# Altium footprint library SAMTEC THD.PcbLib: 161 footprints (part 8 of 12)
Each footprint in its own frame and in the unit in brackets; x right, y up, seen from the top. Pads: shape width x height; smd on the part's side, far side on the other; paste and mask are expansions set on the pad; w line width, h text height; cw(c..) or ccw(c..) is an arc to the next point about the centre after c.
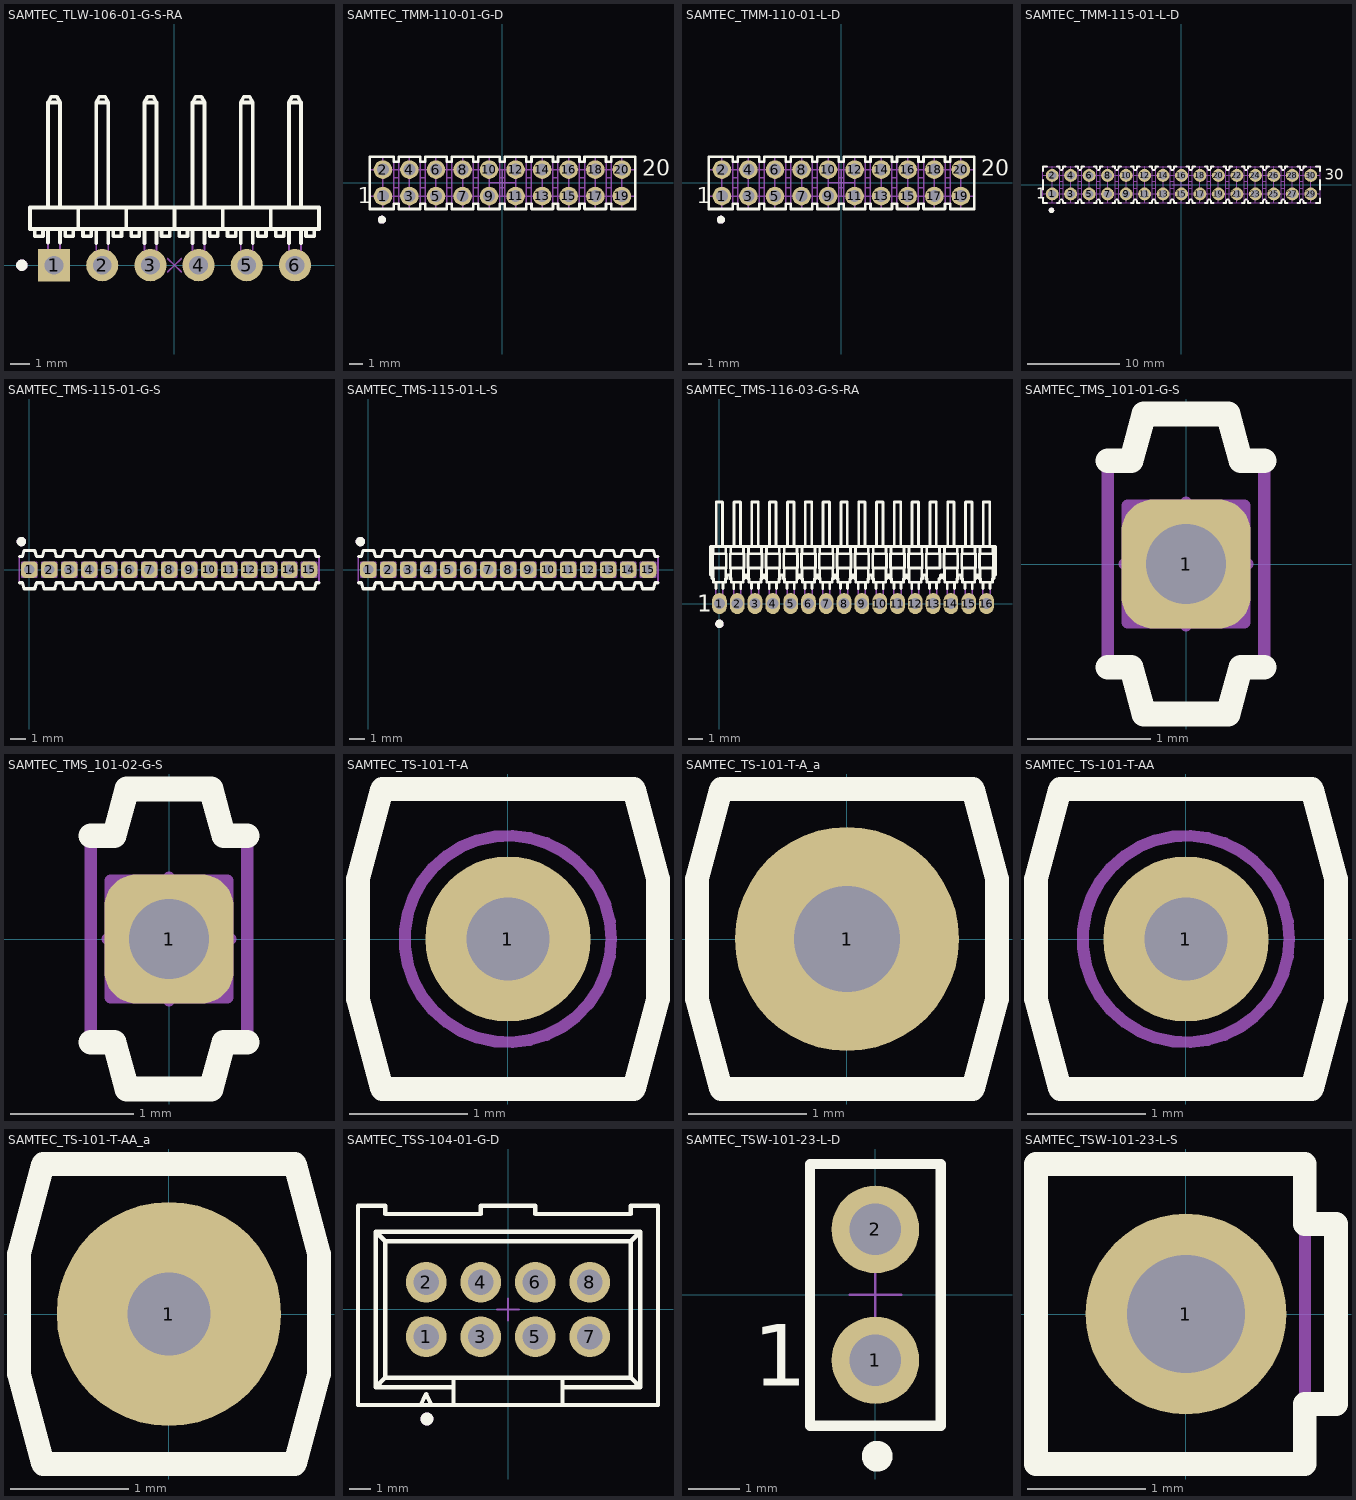
[diagram p7: the footprints below, top view; thin cyan lines are the x and y axes]

## SAMTEC_TLW-106-01-G-S-RA [mm] "6 Contacts - Pitch 2.54mm - Single Row Right Angle Low Profile Strip Header"
height 2.48
pads (6):
  rect 1.7x1.7 hole 1: 1(-6.35,0)
  round 1.7 hole 1: 2(-3.81,0) 3(-1.27,0) 4(1.27,0) 5(3.81,0) 6(6.35,0)
Top Overlay:
  circle w0.3: c-8.05,0 r0.15
  lines w0.2: -7.366,1.905 -7.366,1.524 -6.934,1.524 -6.934,1.905 ; -6.667,1.2 -6.667,1.905 ; -6.667,3.048 -6.667,8.586 ; -6.032,1.2 -6.032,1.905 ; -6.032,3.048 -6.032,8.586 ; -5.766,1.905 -5.766,1.524 -5.334,1.524 -5.334,1.905 ; -5.08,1.905 -5.08,3.048 ; -4.826,1.905 -4.826,1.524 -4.394,1.524 -4.394,1.905 ; -4.127,1.157 -4.127,1.905 ; -4.127,3.048 -4.127,8.586 ; -3.492,1.157 -3.492,1.905 ; -3.492,3.048 -3.492,8.586 ; -3.226,1.905 -3.226,1.524 -2.794,1.524 -2.794,1.905 ; -2.54,1.905 -2.54,3.048 ; -2.286,1.905 -2.286,1.524 -1.854,1.524 -1.854,1.905 ; -1.587,1.157 -1.587,1.905 ; -1.587,3.048 -1.587,8.586 ; -0.952,1.157 -0.952,1.905 ; -0.952,3.048 -0.952,8.586 ; -0.686,1.905 -0.686,1.524 -0.254,1.524 -0.254,1.905 ; 0,1.905 0,3.048 ; 0.254,1.905 0.254,1.524 0.686,1.524 0.686,1.905 ; 0.953,1.157 0.953,1.905 ; 0.953,3.048 0.953,8.586 ; 1.588,1.157 1.588,1.905 ; 1.588,3.048 1.588,8.586 ; 1.854,1.905 1.854,1.524 2.286,1.524 2.286,1.905 ; 2.54,1.905 2.54,3.048 ; 2.794,1.905 2.794,1.524 3.226,1.524 3.226,1.905 ; 3.493,1.157 3.493,1.905 ; 3.493,3.048 3.493,8.586 ; 4.128,1.157 4.128,1.905 ; 4.128,3.048 4.128,8.586 ; 4.394,1.905 4.394,1.524 4.826,1.524 4.826,1.905 ; 5.08,1.905 5.08,3.048 ; 5.334,1.905 5.334,1.524 5.766,1.524 5.766,1.905 ; 6.033,1.157 6.033,1.905 ; 6.033,3.048 6.033,8.586 ; 6.668,1.157 6.668,1.905 ; 6.668,3.048 6.668,8.586 ; 6.934,1.905 6.934,1.524 7.366,1.524 7.366,1.905 ; -6.667,8.586 -6.032,8.586 ; -6.667,8.586 -6.492,8.89 -6.208,8.89 -6.032,8.586 ; -4.127,8.586 -3.492,8.586 ; -4.127,8.586 -3.952,8.89 -3.668,8.89 -3.492,8.586 ; -1.587,8.586 -0.952,8.586 ; -1.587,8.586 -1.412,8.89 -1.128,8.89 -0.952,8.586 ; 0.953,8.586 1.588,8.586 ; 0.953,8.586 1.128,8.89 1.412,8.89 1.588,8.586 ; 3.493,8.586 4.128,8.586 ; 3.493,8.586 3.668,8.89 3.952,8.89 4.128,8.586 ; 6.033,8.586 6.668,8.586 ; 6.033,8.586 6.208,8.89 6.492,8.89 6.668,8.586 ; -7.62,1.905 -7.62,3.048 7.62,3.048 7.62,1.905 -7.62,1.905
Mechanical 8:
  lines w0.1: -6.85,0 -6.35,0 ; -6.35,-0.5 -6.35,0 ; -6.35,0.5 -6.35,0 ; -5.85,0 -6.35,0 ; -4.31,0 -3.81,0 ; -3.81,-0.5 -3.81,0 ; -3.81,0.5 -3.81,0 ; -3.31,0 -3.81,0 ; -1.77,0 -1.27,0 ; -1.27,-0.5 -1.27,0 ; -1.27,0.5 -1.27,0 ; -0.77,0 -1.27,0 ; -0.354,-0.354 0,0 ; -0.354,0.354 0,0 ; 0.354,-0.354 0,0 ; 0.354,0.354 0,0 ; 0.77,0 1.27,0 ; 1.27,-0.5 1.27,0 ; 1.27,0.5 1.27,0 ; 1.77,0 1.27,0 ; 3.31,0 3.81,0 ; 3.81,-0.5 3.81,0 ; 3.81,0.5 3.81,0 ; 4.31,0 3.81,0 ; 5.85,0 6.35,0 ; 6.35,-0.5 6.35,0 ; 6.35,0.5 6.35,0 ; 6.85,0 6.35,0
Mechanical 14:
  circle w0.3: c-8.05,0 r0.15
  lines w0.1: -7.366,1.905 -7.366,1.524 -6.934,1.524 -6.934,1.905 ; -6.667,1.905 -6.667,-0.318 -6.032,-0.318 -6.032,1.905 ; -6.667,3.048 -6.667,8.586 ; -6.032,3.048 -6.032,8.586 ; -5.766,1.905 -5.766,1.524 -5.334,1.524 -5.334,1.905 ; -5.08,1.905 -5.08,3.048 ; -4.826,1.905 -4.826,1.524 -4.394,1.524 -4.394,1.905 ; -4.127,1.905 -4.127,-0.318 -3.492,-0.318 -3.492,1.905 ; -4.127,3.048 -4.127,8.586 ; -3.492,3.048 -3.492,8.586 ; -3.226,1.905 -3.226,1.524 -2.794,1.524 -2.794,1.905 ; -2.54,1.905 -2.54,3.048 ; -2.286,1.905 -2.286,1.524 -1.854,1.524 -1.854,1.905 ; -1.587,1.905 -1.587,-0.318 -0.952,-0.318 -0.952,1.905 ; -1.587,3.048 -1.587,8.586 ; -0.952,3.048 -0.952,8.586 ; -0.686,1.905 -0.686,1.524 -0.254,1.524 -0.254,1.905 ; 0,1.905 0,3.048 ; 0.254,1.905 0.254,1.524 0.686,1.524 0.686,1.905 ; 0.953,1.905 0.953,-0.318 1.588,-0.318 1.588,1.905 ; 0.953,3.048 0.953,8.586 ; 1.588,3.048 1.588,8.586 ; 1.854,1.905 1.854,1.524 2.286,1.524 2.286,1.905 ; 2.54,1.905 2.54,3.048 ; 2.794,1.905 2.794,1.524 3.226,1.524 3.226,1.905 ; 3.493,1.905 3.493,-0.318 4.128,-0.318 4.128,1.905 ; 3.493,3.048 3.493,8.586 ; 4.128,3.048 4.128,8.586 ; 4.394,1.905 4.394,1.524 4.826,1.524 4.826,1.905 ; 5.08,1.905 5.08,3.048 ; 5.334,1.905 5.334,1.524 5.766,1.524 5.766,1.905 ; 6.033,1.905 6.033,-0.318 6.668,-0.318 6.668,1.905 ; 6.033,3.048 6.033,8.586 ; 6.668,3.048 6.668,8.586 ; 6.934,1.905 6.934,1.524 7.366,1.524 7.366,1.905 ; -6.667,8.586 -6.032,8.586 ; -6.667,8.586 -6.492,8.89 -6.208,8.89 -6.032,8.586 ; -4.127,8.586 -3.492,8.586 ; -4.127,8.586 -3.952,8.89 -3.668,8.89 -3.492,8.586 ; -1.587,8.586 -0.952,8.586 ; -1.587,8.586 -1.412,8.89 -1.128,8.89 -0.952,8.586 ; 0.953,8.586 1.588,8.586 ; 0.953,8.586 1.128,8.89 1.412,8.89 1.588,8.586 ; 3.493,8.586 4.128,8.586 ; 3.493,8.586 3.668,8.89 3.952,8.89 4.128,8.586 ; 6.033,8.586 6.668,8.586 ; 6.033,8.586 6.208,8.89 6.492,8.89 6.668,8.586 ; -7.62,1.905 -7.62,3.048 7.62,3.048 7.62,1.905 -7.62,1.905
3D body "SAMTEC_TLW-106-01-G-S-RA.stp": height 2.49, standoff -3.05, extent -7.62,-0.317 7.62,8.89

## SAMTEC_TMM-110-01-G-D [mm] "20 Contacts - Pitch 2mm - Dual Row Straight Strip Header - Insulator 1.5mm"
height 4.7
pads (20):
  round 1.4 hole 0.9: 1(-9,-1) 2(-9,1) 3(-7,-1) 4(-7,1) 5(-5,-1) 6(-5,1) 7(-3,-1) 8(-3,1) 9(-1,-1) 10(-1,1) 11(1,-1) 12(1,1) 13(3,-1) 14(3,1) 15(5,-1) 16(5,1) 17(7,-1) 18(7,1) 19(9,-1) 20(9,1)
Top Overlay:
  circle w0.3: c-9.073,-2.778 r0.15
  lines w0.2: -10,-1.968 -8.19,-1.968 -8.19,-1.587 -7.809,-1.587 -7.809,-1.968 -6.19,-1.968 -6.19,-1.587 -5.809,-1.587 -5.809,-1.968 -4.19,-1.968 -4.19,-1.587 -3.809,-1.587 -3.809,-1.968 -2.19,-1.968 -2.19,-1.587 -1.809,-1.587 -1.809,-1.968 -0.19,-1.968 -0.19,-1.587 0.191,-1.587 0.191,-1.968 1.81,-1.968 1.81,-1.587 2.191,-1.587 2.191,-1.968 3.81,-1.968 3.81,-1.587 4.191,-1.587 4.191,-1.968 5.81,-1.968 5.81,-1.587 6.191,-1.587 6.191,-1.968 7.81,-1.968 7.81,-1.587 8.191,-1.587 8.191,-1.968 10.004,-1.968 10.004,1.968 8.191,1.968 8.191,1.587 7.81,1.587 7.81,1.968 6.191,1.968 6.191,1.587 5.81,1.587 5.81,1.968 4.191,1.968 4.191,1.587 3.81,1.587 3.81,1.968 2.191,1.968 2.191,1.587 1.81,1.587 1.81,1.968 0.191,1.968 0.191,1.587 -0.19,1.587 -0.19,1.968 -1.809,1.968 -1.809,1.587 -2.19,1.587 -2.19,1.968 -3.809,1.968 -3.809,1.587 -4.19,1.587 -4.19,1.968 -5.809,1.968 -5.809,1.587 -6.19,1.587 -6.19,1.968 -7.809,1.968 -7.809,1.587 -8.19,1.587 -8.19,1.968 -10,1.968 -10,-1.968
  text "20" at 10.525,0.55 h1.2
  text "1" at -10.875,-1.525 h1.2
Mechanical 8:
  lines w0.1: -10,-1 -9,-1 ; -10,1 -9,1 ; -9,-2 -9,-1 ; -9,2 -9,1 ; -7,-2 -7,-1 ; -7,2 -7,1 ; -5,-2 -5,-1 ; -5,2 -5,1 ; -3,-2 -3,-1 ; -3,2 -3,1 ; -1,-2 -1,-1 ; -1,2 -1,1 ; 1,-2 1,-1 ; 1,2 1,1 ; 3,-2 3,-1 ; 3,2 3,1 ; 5,-2 5,-1 ; 5,2 5,1 ; 7,-2 7,-1 ; 7,2 7,1 ; 9,-2 9,-1 ; 9,2 9,1 ; 10,-1 9,-1 ; 10,1 9,1 ; -9,-1 -8,-1 -7,-1 ; -9,-1 -9,0 -9,1 ; -9,1 -8,1 -7,1 ; -7,-1 -6,-1 -5,-1 ; -7,-1 -7,0 -7,1 ; -7,1 -6,1 -5,1 ; -5,-1 -4,-1 -3,-1 ; -5,-1 -5,0 -5,1 ; -5,1 -4,1 -3,1 ; -3,-1 -2,-1 -1,-1 ; -3,-1 -3,0 -3,1 ; -3,1 -2,1 -1,1 ; -1,-1 0,-1 ; -1,-1 -1,0 ; -1,0 -1,1 ; -1,0 0,0 ; -1,1 0,1 ; 0,-1 0,0 ; 0,-1 1,-1 ; 0,0 1,0 ; 0,0 0,1 ; 0,1 1,1 ; 1,-1 2,-1 3,-1 ; 1,-1 1,0 ; 1,0 1,1 ; 1,1 2,1 3,1 ; 3,-1 4,-1 5,-1 ; 3,-1 3,0 3,1 ; 3,1 4,1 5,1 ; 5,-1 6,-1 7,-1 ; 5,-1 5,0 5,1 ; 5,1 6,1 7,1 ; 7,-1 8,-1 9,-1 ; 7,-1 7,0 7,1 ; 7,1 8,1 9,1 ; 9,-1 9,0 9,1
Mechanical 14:
  drawing of 157 lines, arcs and shapes, not listed
  text "20" at 10.525,0.55 h1.2
  text "1" at -10.875,-1.525 h1.2
3D body "SAMTEC_TMM-110-01-G-D.stp": height 4.7, standoff -3.5, extent -10,-1.968 10,1.969

## SAMTEC_TMM-110-01-L-D [mm] "20 Contacts - Pitch 2mm - Dual Row Straight Strip Header - Insulator 1.5mm"
height 4.7
pads (20):
  round 1.4 hole 0.9: 1(-9,-1) 2(-9,1) 3(-7,-1) 4(-7,1) 5(-5,-1) 6(-5,1) 7(-3,-1) 8(-3,1) 9(-1,-1) 10(-1,1) 11(1,-1) 12(1,1) 13(3,-1) 14(3,1) 15(5,-1) 16(5,1) 17(7,-1) 18(7,1) 19(9,-1) 20(9,1)
Top Overlay:
  circle w0.3: c-9.073,-2.778 r0.15
  lines w0.2: -10,-1.968 -10,1.968 -8.19,1.968 -8.19,1.587 -7.809,1.587 -7.809,1.968 -6.19,1.968 -6.19,1.587 -5.809,1.587 -5.809,1.968 -4.19,1.968 -4.19,1.587 -3.809,1.587 -3.809,1.968 -2.19,1.968 -2.19,1.587 -1.809,1.587 -1.809,1.968 -0.19,1.968 -0.19,1.587 0.191,1.587 0.191,1.968 1.81,1.968 1.81,1.587 2.191,1.587 2.191,1.968 3.81,1.968 3.81,1.587 4.191,1.587 4.191,1.968 5.81,1.968 5.81,1.587 6.191,1.587 6.191,1.968 7.81,1.968 7.81,1.587 8.191,1.587 8.191,1.968 10.004,1.968 10.004,-1.968 8.191,-1.968 8.191,-1.587 7.81,-1.587 7.81,-1.968 6.191,-1.968 6.191,-1.587 5.81,-1.587 5.81,-1.968 4.191,-1.968 4.191,-1.587 3.81,-1.587 3.81,-1.968 2.191,-1.968 2.191,-1.587 1.81,-1.587 1.81,-1.968 0.191,-1.968 0.191,-1.587 -0.19,-1.587 -0.19,-1.968 -1.809,-1.968 -1.809,-1.587 -2.19,-1.587 -2.19,-1.968 -3.809,-1.968 -3.809,-1.587 -4.19,-1.587 -4.19,-1.968 -5.809,-1.968 -5.809,-1.587 -6.19,-1.587 -6.19,-1.968 -7.809,-1.968 -7.809,-1.587 -8.19,-1.587 -8.19,-1.968 -10,-1.968
  text "20" at 10.525,0.55 h1.2
  text "1" at -10.875,-1.525 h1.2
Mechanical 8:
  lines w0.1: -10,-1 -9,-1 ; -10,1 -9,1 ; -9,-2 -9,-1 ; -9,2 -9,1 ; -7,-2 -7,-1 ; -7,2 -7,1 ; -5,-2 -5,-1 ; -5,2 -5,1 ; -3,-2 -3,-1 ; -3,2 -3,1 ; -1,-2 -1,-1 ; -1,2 -1,1 ; 1,-2 1,-1 ; 1,2 1,1 ; 3,-2 3,-1 ; 3,2 3,1 ; 5,-2 5,-1 ; 5,2 5,1 ; 7,-2 7,-1 ; 7,2 7,1 ; 9,-2 9,-1 ; 9,2 9,1 ; 10,-1 9,-1 ; 10,1 9,1 ; -9,-1 -9,0 -9,1 ; -9,-1 -8,-1 -7,-1 ; -9,1 -8,1 -7,1 ; -7,-1 -7,0 -7,1 ; -7,-1 -6,-1 -5,-1 ; -7,1 -6,1 -5,1 ; -5,-1 -5,0 -5,1 ; -5,-1 -4,-1 -3,-1 ; -5,1 -4,1 -3,1 ; -3,-1 -3,0 -3,1 ; -3,-1 -2,-1 -1,-1 ; -3,1 -2,1 -1,1 ; -1,-1 -1,0 ; -1,-1 0,-1 ; -1,0 0,0 ; -1,0 -1,1 ; -1,1 0,1 ; 0,-1 1,-1 ; 0,-1 0,0 ; 0,0 0,1 ; 0,0 1,0 ; 0,1 1,1 ; 1,-1 1,0 ; 1,-1 2,-1 3,-1 ; 1,0 1,1 ; 1,1 2,1 3,1 ; 3,-1 3,0 3,1 ; 3,-1 4,-1 5,-1 ; 3,1 4,1 5,1 ; 5,-1 5,0 5,1 ; 5,-1 6,-1 7,-1 ; 5,1 6,1 7,1 ; 7,-1 7,0 7,1 ; 7,-1 8,-1 9,-1 ; 7,1 8,1 9,1 ; 9,-1 9,0 9,1
Mechanical 14:
  drawing of 157 lines, arcs and shapes, not listed
  text "20" at 10.525,0.55 h1.2
  text "1" at -10.875,-1.525 h1.2
3D body "SAMTEC_TMM-110-01-L-D.stp": height 4.7, standoff -3.5, extent -10,-1.968 10,1.969

## SAMTEC_TMM-115-01-L-D [mm] "30 Contacts - Pitch 2mm - Dual Row Straight Strip Header - Insulator 1.5mm"
height 4.7
pads (30):
  round 1.4 hole 0.9: 1(-14,-1) 2(-14,1) 3(-12,-1) 4(-12,1) 5(-10,-1) 6(-10,1) 7(-8,-1) 8(-8,1) 9(-6,-1) 10(-6,1) 11(-4,-1) 12(-4,1) 13(-2,-1) 14(-2,1) 15(0,-1) 16(0,1) 17(2,-1) 18(2,1) 19(4,-1) 20(4,1) 21(6,-1) 22(6,1) 23(8,-1) 24(8,1) 25(10,-1) 26(10,1) 27(12,-1) 28(12,1) 29(14,-1) 30(14,1)
Top Overlay:
  drawing of 151 lines, arcs and shapes, not listed
  text "30" at 15.525,0.55 h1.2
  text "1" at -15.75,-1.525 h1.2
Mechanical 8:
  lines w0.1: -15,-1 -14,-1 ; -15,1 -14,1 ; -14,-2 -14,-1 ; -14,2 -14,1 ; -12,-2 -12,-1 ; -12,2 -12,1 ; -10,-2 -10,-1 ; -10,2 -10,1 ; -8,-2 -8,-1 ; -8,2 -8,1 ; -6,-2 -6,-1 ; -6,2 -6,1 ; -4,-2 -4,-1 ; -4,2 -4,1 ; -2,-2 -2,-1 ; -2,2 -2,1 ; -1,0 0,0 ; 0,-2 0,-1 ; 0,2 0,1 ; 1,0 0,0 ; 2,-2 2,-1 ; 2,2 2,1 ; 4,-2 4,-1 ; 4,2 4,1 ; 6,-2 6,-1 ; 6,2 6,1 ; 8,-2 8,-1 ; 8,2 8,1 ; 10,-2 10,-1 ; 10,2 10,1 ; 12,-2 12,-1 ; 12,2 12,1 ; 14,-2 14,-1 ; 14,2 14,1 ; 15,-1 14,-1 ; 15,1 14,1 ; -14,-1 -13,-1 -12,-1 ; -14,-1 -14,0 -14,1 ; -14,1 -13,1 -12,1 ; -12,-1 -11,-1 -10,-1 ; -12,-1 -12,0 -12,1 ; -12,1 -11,1 -10,1 ; -10,-1 -9,-1 -8,-1 ; -10,-1 -10,0 -10,1 ; -10,1 -9,1 -8,1 ; -8,-1 -7,-1 -6,-1 ; -8,-1 -8,0 -8,1 ; -8,1 -7,1 -6,1 ; -6,-1 -5,-1 -4,-1 ; -6,-1 -6,0 -6,1 ; -6,1 -5,1 -4,1 ; -4,-1 -3,-1 -2,-1 ; -4,-1 -4,0 -4,1 ; -4,1 -3,1 -2,1 ; -2,-1 -1,-1 0,-1 ; -2,-1 -2,0 -2,1 ; -2,1 -1,1 0,1 ; 0,-1 0,0 ; 0,-1 1,-1 2,-1 ; 0,-1 0,0 ; 0,0 0,1 ; 0,0 0,1 ; 0,1 1,1 2,1 ; 2,-1 3,-1 4,-1 ; 2,-1 2,0 2,1 ; 2,1 3,1 4,1 ; 4,-1 4,0 4,1 ; 4,-1 5,-1 6,-1 ; 4,1 5,1 6,1 ; 6,-1 6,0 6,1 ; 6,-1 7,-1 8,-1 ; 6,1 7,1 8,1 ; 8,-1 8,0 8,1 ; 8,-1 9,-1 10,-1 ; 8,1 9,1 10,1 ; 10,-1 10,0 10,1 ; 10,-1 11,-1 12,-1 ; 10,1 11,1 12,1 ; 12,-1 12,0 12,1 ; 12,-1 13,-1 14,-1 ; 12,1 13,1 14,1 ; 14,-1 14,0 14,1
Mechanical 14:
  drawing of 237 lines, arcs and shapes, not listed
  text "30" at 15.525,0.55 h1.2
  text "1" at -15.75,-1.525 h1.2
3D body "SAMTEC_TMM-115-01-L-D.stp": height 4.7, standoff -3.5, extent -15,-1.968 15,1.969

## SAMTEC_TMS-115-01-G-S [mm] "1.27mm Pitch SIL Vertical PC Tail Header"
height 8.13
pads (15):
  rrect50% 1.05x1.05 hole 0.65: 1(0,0) 2(1.27,0) 3(2.54,0) 4(3.81,0) 5(5.08,0) 6(6.35,0) 7(7.62,0) 8(8.89,0) 9(10.16,0) 10(11.43,0) 11(12.7,0) 12(13.97,0) 13(15.24,0) 14(16.51,0) 15(17.78,0)
Top Overlay:
  circle w0.3: c-0.508,1.778 r0.15
  lines w0.2: -0.635,-0.838 -0.445,-0.838 -0.342,-1.219 0.342,-1.219 0.445,-0.838 0.826,-0.838 0.928,-1.219 1.612,-1.219 1.714,-0.838 2.095,-0.838 2.198,-1.219 2.882,-1.219 2.985,-0.838 3.366,-0.838 3.468,-1.219 4.152,-1.219 4.255,-0.838 4.636,-0.838 4.738,-1.219 5.422,-1.219 5.525,-0.838 5.906,-0.838 6.008,-1.219 6.692,-1.219 6.795,-0.838 7.176,-0.838 7.278,-1.219 7.962,-1.219 8.065,-0.838 8.446,-0.838 8.548,-1.219 9.232,-1.219 9.335,-0.838 9.716,-0.838 9.818,-1.219 10.502,-1.219 10.605,-0.838 10.986,-0.838 11.088,-1.219 11.772,-1.219 11.875,-0.838 12.256,-0.838 12.358,-1.219 13.042,-1.219 13.145,-0.838 13.526,-0.838 13.628,-1.219 14.312,-1.219 14.415,-0.838 14.796,-0.838 14.898,-1.219 15.582,-1.219 15.685,-0.838 16.066,-0.838 16.168,-1.219 16.852,-1.219 16.955,-0.838 17.336,-0.838 17.438,-1.219 18.122,-1.219 18.225,-0.838 18.415,-0.838 ; -0.635,0.838 -0.445,0.838 -0.342,1.219 0.342,1.219 0.445,0.838 0.826,0.838 0.928,1.219 1.612,1.219 1.714,0.838 2.095,0.838 2.198,1.219 2.882,1.219 2.985,0.838 3.366,0.838 3.468,1.219 4.152,1.219 4.255,0.838 4.636,0.838 4.738,1.219 5.422,1.219 5.525,0.838 5.906,0.838 6.008,1.219 6.692,1.219 6.795,0.838 7.176,0.838 7.278,1.219 7.962,1.219 8.065,0.838 8.446,0.838 8.548,1.219 9.232,1.219 9.335,0.838 9.716,0.838 9.818,1.219 10.502,1.219 10.605,0.838 10.986,0.838 11.088,1.219 11.772,1.219 11.875,0.838 12.256,0.838 12.358,1.219 13.042,1.219 13.145,0.838 13.526,0.838 13.628,1.219 14.312,1.219 14.415,0.838 14.796,0.838 14.898,1.219 15.582,1.219 15.685,0.838 16.066,0.838 16.168,1.219 16.852,1.219 16.955,0.838 17.336,0.838 17.438,1.219 18.122,1.219 18.225,0.838 18.415,0.838
Mechanical 8:
  lines w0.1: -0.5,0 0,0 ; 0,-0.5 0,0 ; 0,0.5 0,0 ; 0.5,0 0,0 ; 0.77,0 1.27,0 ; 1.27,-0.5 1.27,0 ; 1.27,0.5 1.27,0 ; 1.77,0 1.27,0 ; 2.04,0 2.54,0 ; 2.54,-0.5 2.54,0 ; 2.54,0.5 2.54,0 ; 3.04,0 2.54,0 ; 3.31,0 3.81,0 ; 3.81,-0.5 3.81,0 ; 3.81,0.5 3.81,0 ; 4.31,0 3.81,0 ; 4.58,0 5.08,0 ; 5.08,-0.5 5.08,0 ; 5.08,0.5 5.08,0 ; 5.58,0 5.08,0 ; 5.85,0 6.35,0 ; 6.35,-0.5 6.35,0 ; 6.35,0.5 6.35,0 ; 6.85,0 6.35,0 ; 7.12,0 7.62,0 ; 7.62,-0.5 7.62,0 ; 7.62,0.5 7.62,0 ; 8.12,0 7.62,0 ; 8.39,0 8.89,0 ; 8.89,-0.5 8.89,0 ; 8.89,0.5 8.89,0 ; 9.39,0 8.89,0 ; 9.66,0 10.16,0 ; 10.16,-0.5 10.16,0 ; 10.16,0.5 10.16,0 ; 10.66,0 10.16,0 ; 10.93,0 11.43,0 ; 11.43,-0.5 11.43,0 ; 11.43,0.5 11.43,0 ; 11.93,0 11.43,0 ; 12.2,0 12.7,0 ; 12.7,-0.5 12.7,0 ; 12.7,0.5 12.7,0 ; 13.2,0 12.7,0 ; 13.47,0 13.97,0 ; 13.97,-0.5 13.97,0 ; 13.97,0.5 13.97,0 ; 14.47,0 13.97,0 ; 14.74,0 15.24,0 ; 15.24,-0.5 15.24,0 ; 15.24,0.5 15.24,0 ; 15.74,0 15.24,0 ; 16.01,0 16.51,0 ; 16.51,-0.5 16.51,0 ; 16.51,0.5 16.51,0 ; 17.01,0 16.51,0 ; 17.28,0 17.78,0 ; 17.78,-0.5 17.78,0 ; 17.78,0.5 17.78,0 ; 18.28,0 17.78,0
Mechanical 14:
  drawing of 425 lines, arcs and shapes, not listed
3D body "SAMTEC_TMS-115-01-G-S.stp": height 5.08, standoff -3.05, extent -0.635,-1.219 18.415,1.219

## SAMTEC_TMS-115-01-L-S [mm] "1.27mm Pitch SIL Vertical PC Tail Header"
height 8.13
pads (15):
  rrect50% 1.05x1.05 hole 0.65: 1(0,0) 2(1.27,0) 3(2.54,0) 4(3.81,0) 5(5.08,0) 6(6.35,0) 7(7.62,0) 8(8.89,0) 9(10.16,0) 10(11.43,0) 11(12.7,0) 12(13.97,0) 13(15.24,0) 14(16.51,0) 15(17.78,0)
Top Overlay:
  circle w0.3: c-0.508,1.778 r0.15
  lines w0.2: -0.635,-0.838 -0.445,-0.838 -0.342,-1.219 0.342,-1.219 0.445,-0.838 0.826,-0.838 0.928,-1.219 1.612,-1.219 1.714,-0.838 2.095,-0.838 2.198,-1.219 2.882,-1.219 2.985,-0.838 3.366,-0.838 3.468,-1.219 4.152,-1.219 4.255,-0.838 4.636,-0.838 4.738,-1.219 5.422,-1.219 5.525,-0.838 5.906,-0.838 6.008,-1.219 6.692,-1.219 6.795,-0.838 7.176,-0.838 7.278,-1.219 7.962,-1.219 8.065,-0.838 8.446,-0.838 8.548,-1.219 9.232,-1.219 9.335,-0.838 9.716,-0.838 9.818,-1.219 10.502,-1.219 10.605,-0.838 10.986,-0.838 11.088,-1.219 11.772,-1.219 11.875,-0.838 12.256,-0.838 12.358,-1.219 13.042,-1.219 13.145,-0.838 13.526,-0.838 13.628,-1.219 14.312,-1.219 14.415,-0.838 14.796,-0.838 14.898,-1.219 15.582,-1.219 15.685,-0.838 16.066,-0.838 16.168,-1.219 16.852,-1.219 16.955,-0.838 17.336,-0.838 17.438,-1.219 18.122,-1.219 18.225,-0.838 18.415,-0.838 ; -0.635,0.838 -0.445,0.838 -0.342,1.219 0.342,1.219 0.445,0.838 0.826,0.838 0.928,1.219 1.612,1.219 1.714,0.838 2.095,0.838 2.198,1.219 2.882,1.219 2.985,0.838 3.366,0.838 3.468,1.219 4.152,1.219 4.255,0.838 4.636,0.838 4.738,1.219 5.422,1.219 5.525,0.838 5.906,0.838 6.008,1.219 6.692,1.219 6.795,0.838 7.176,0.838 7.278,1.219 7.962,1.219 8.065,0.838 8.446,0.838 8.548,1.219 9.232,1.219 9.335,0.838 9.716,0.838 9.818,1.219 10.502,1.219 10.605,0.838 10.986,0.838 11.088,1.219 11.772,1.219 11.875,0.838 12.256,0.838 12.358,1.219 13.042,1.219 13.145,0.838 13.526,0.838 13.628,1.219 14.312,1.219 14.415,0.838 14.796,0.838 14.898,1.219 15.582,1.219 15.685,0.838 16.066,0.838 16.168,1.219 16.852,1.219 16.955,0.838 17.336,0.838 17.438,1.219 18.122,1.219 18.225,0.838 18.415,0.838
Mechanical 8:
  lines w0.1: -0.5,0 0,0 ; 0,-0.5 0,0 ; 0,0.5 0,0 ; 0.5,0 0,0 ; 0.77,0 1.27,0 ; 1.27,-0.5 1.27,0 ; 1.27,0.5 1.27,0 ; 1.77,0 1.27,0 ; 2.04,0 2.54,0 ; 2.54,-0.5 2.54,0 ; 2.54,0.5 2.54,0 ; 3.04,0 2.54,0 ; 3.31,0 3.81,0 ; 3.81,-0.5 3.81,0 ; 3.81,0.5 3.81,0 ; 4.31,0 3.81,0 ; 4.58,0 5.08,0 ; 5.08,-0.5 5.08,0 ; 5.08,0.5 5.08,0 ; 5.58,0 5.08,0 ; 5.85,0 6.35,0 ; 6.35,-0.5 6.35,0 ; 6.35,0.5 6.35,0 ; 6.85,0 6.35,0 ; 7.12,0 7.62,0 ; 7.62,-0.5 7.62,0 ; 7.62,0.5 7.62,0 ; 8.12,0 7.62,0 ; 8.39,0 8.89,0 ; 8.89,-0.5 8.89,0 ; 8.89,0.5 8.89,0 ; 9.39,0 8.89,0 ; 9.66,0 10.16,0 ; 10.16,-0.5 10.16,0 ; 10.16,0.5 10.16,0 ; 10.66,0 10.16,0 ; 10.93,0 11.43,0 ; 11.43,-0.5 11.43,0 ; 11.43,0.5 11.43,0 ; 11.93,0 11.43,0 ; 12.2,0 12.7,0 ; 12.7,-0.5 12.7,0 ; 12.7,0.5 12.7,0 ; 13.2,0 12.7,0 ; 13.47,0 13.97,0 ; 13.97,-0.5 13.97,0 ; 13.97,0.5 13.97,0 ; 14.47,0 13.97,0 ; 14.74,0 15.24,0 ; 15.24,-0.5 15.24,0 ; 15.24,0.5 15.24,0 ; 15.74,0 15.24,0 ; 16.01,0 16.51,0 ; 16.51,-0.5 16.51,0 ; 16.51,0.5 16.51,0 ; 17.01,0 16.51,0 ; 17.28,0 17.78,0 ; 17.78,-0.5 17.78,0 ; 17.78,0.5 17.78,0 ; 18.28,0 17.78,0
Mechanical 14:
  drawing of 425 lines, arcs and shapes, not listed
3D body "SAMTEC_TMS-115-01-L-S.stp": height 5.08, standoff -3.05, extent -0.635,-1.219 18.415,1.219

## SAMTEC_TMS-116-03-G-S-RA [mm] "16 Contacts, Pitch 1.27mm, Single Row (SIL) Through-Hole Micro Header (Post Lead 3.18mm, Tail Lead 3.56mm)"
height 2.48
pads (16):
  oval 1.05x1.5 hole 0.8: 1(0,0) 2(1.27,0) 3(2.54,0) 4(3.81,0) 5(5.08,0) 6(6.35,0) 7(7.62,0) 8(8.89,0) 9(10.16,0) 10(11.43,0) 11(12.7,0) 12(13.97,0) 13(15.24,0) 14(16.51,0) 15(17.78,0) 16(19.05,0)
Top Overlay:
  drawing of 340 lines, arcs and shapes, not listed
  text "1" at -1.6,-0.6 h1.2
Mechanical 8:
  lines w0.05: -0.5,0 0,0 ; 0,-0.5 0,0 ; 0,0.5 0,0 ; 0.5,0 0,0 ; 0.77,0 1.27,0 ; 1.27,-0.5 1.27,0 ; 1.27,0.5 1.27,0 ; 1.77,0 1.27,0 ; 2.04,0 2.54,0 ; 2.54,-0.5 2.54,0 ; 2.54,0.5 2.54,0 ; 3.04,0 2.54,0 ; 3.31,0 3.81,0 ; 3.81,-0.5 3.81,0 ; 3.81,0.5 3.81,0 ; 4.31,0 3.81,0 ; 4.58,0 5.08,0 ; 5.08,-0.5 5.08,0 ; 5.08,0.5 5.08,0 ; 5.58,0 5.08,0 ; 5.85,0 6.35,0 ; 6.35,-0.5 6.35,0 ; 6.35,0.5 6.35,0 ; 6.85,0 6.35,0 ; 7.12,0 7.62,0 ; 7.62,-0.5 7.62,0 ; 7.62,0.5 7.62,0 ; 8.12,0 7.62,0 ; 8.39,0 8.89,0 ; 8.89,-0.5 8.89,0 ; 8.89,0.5 8.89,0 ; 9.39,0 8.89,0 ; 9.66,0 10.16,0 ; 10.16,-0.5 10.16,0 ; 10.16,0.5 10.16,0 ; 10.66,0 10.16,0 ; 10.93,0 11.43,0 ; 11.43,-0.5 11.43,0 ; 11.43,0.5 11.43,0 ; 11.93,0 11.43,0 ; 12.2,0 12.7,0 ; 12.7,-0.5 12.7,0 ; 12.7,0.5 12.7,0 ; 13.2,0 12.7,0 ; 13.47,0 13.97,0 ; 13.97,-0.5 13.97,0 ; 13.97,0.5 13.97,0 ; 14.47,0 13.97,0 ; 14.74,0 15.24,0 ; 15.24,-0.5 15.24,0 ; 15.24,0.5 15.24,0 ; 15.74,0 15.24,0 ; 16.01,0 16.51,0 ; 16.51,-0.5 16.51,0 ; 16.51,0.5 16.51,0 ; 17.01,0 16.51,0 ; 17.28,0 17.78,0 ; 17.78,-0.5 17.78,0 ; 17.78,0.5 17.78,0 ; 18.28,0 17.78,0 ; 18.55,0 19.05,0 ; 19.05,-0.5 19.05,0 ; 19.05,0.5 19.05,0 ; 19.55,0 19.05,0
Mechanical 14:
  drawing of 372 lines, arcs and shapes, not listed
  text "1" at -1.6,-0.6 h1.2
3D body "SAMTEC_TMS-116-03-G-S-RA.stp": height 2.44, standoff -3.56, extent -0.635,-0.254 19.685,7.239

## SAMTEC_TMS_101-01-G-S [mm] "1 Contacts - Pitch 1.27mm -Single Row (SIL) Through Mount Header"
height 8.38
pads (1):
  rrect50% 1.05x1.05 hole 0.65: 1(0,0)
Top Overlay:
  lines w0.2: -0.635,-0.838 -0.445,-0.838 -0.342,-1.219 0.342,-1.219 0.445,-0.838 0.635,-0.838 ; -0.635,0.838 -0.445,0.838 -0.342,1.219 0.342,1.219 0.445,0.838 0.635,0.838
Mechanical 8:
  lines w0.1: -0.5,0 0,0 ; 0,-0.5 0,0 ; 0,0.5 0,0 ; 0.5,0 0,0
Mechanical 14:
  lines w0.1: -0.222,-0.222 -0.476,-0.476 ; -0.222,0.222 -0.476,0.476 ; 0.222,-0.222 0.476,-0.476 ; 0.222,0.222 0.476,0.476 ; -0.476,-0.476 -0.476,0.476 ; -0.476,-0.476 0.476,-0.476 ; -0.476,0.476 0.476,0.476 ; -0.23,-0.23 -0.103,-0.103 ; -0.23,-0.23 -0.23,0.23 ; -0.23,-0.23 0.23,-0.23 ; -0.23,0.23 -0.103,0.103 ; -0.23,0.23 0.23,0.23 ; -0.103,-0.103 -0.103,0.103 ; -0.103,-0.103 0.103,-0.103 ; -0.103,0.103 0.103,0.103 ; 0.103,-0.103 0.23,-0.23 ; 0.103,-0.103 0.103,0.103 ; 0.103,0.103 0.23,0.23 ; 0.23,-0.23 0.23,0.23 ; 0.476,-0.476 0.476,0.476 ; -0.635,-0.838 -0.445,-0.838 -0.342,-1.219 0.342,-1.219 0.445,-0.838 0.635,-0.838 0.635,0.838 0.445,0.838 0.342,1.219 -0.342,1.219 -0.445,0.838 -0.635,0.838 -0.635,-0.838
3D body "SAMTEC_TMS_101-01-G-S.stp": height 8.38, standoff -3.05, extent -0.635,-1.219 0.635,1.219

## SAMTEC_TMS_101-02-G-S [mm] "1 Contacts - Pitch 1.27mm -Single Row (SIL) Through Mount Header"
height 5.08
pads (1):
  rrect50% 1.05x1.05 hole 0.65: 1(0,0)
Top Overlay:
  lines w0.2: -0.635,-0.838 -0.445,-0.838 -0.342,-1.219 0.342,-1.219 0.445,-0.838 0.635,-0.838 ; -0.635,0.838 -0.445,0.838 -0.342,1.219 0.342,1.219 0.445,0.838 0.635,0.838
Mechanical 8:
  lines w0.1: -0.5,0 0,0 ; 0,-0.5 0,0 ; 0,0.5 0,0 ; 0.5,0 0,0
Mechanical 14:
  lines w0.1: -0.222,-0.222 -0.476,-0.476 ; -0.222,0.222 -0.476,0.476 ; 0.222,-0.222 0.476,-0.476 ; 0.222,0.222 0.476,0.476 ; -0.476,-0.476 -0.476,0.476 ; -0.476,-0.476 0.476,-0.476 ; -0.476,0.476 0.476,0.476 ; -0.23,-0.23 -0.103,-0.103 ; -0.23,-0.23 -0.23,0.23 ; -0.23,-0.23 0.23,-0.23 ; -0.23,0.23 -0.103,0.103 ; -0.23,0.23 0.23,0.23 ; -0.103,-0.103 -0.103,0.103 ; -0.103,-0.103 0.103,-0.103 ; -0.103,0.103 0.103,0.103 ; 0.103,-0.103 0.23,-0.23 ; 0.103,-0.103 0.103,0.103 ; 0.103,0.103 0.23,0.23 ; 0.23,-0.23 0.23,0.23 ; 0.476,-0.476 0.476,0.476 ; -0.635,-0.838 -0.445,-0.838 -0.342,-1.219 0.342,-1.219 0.445,-0.838 0.635,-0.838 0.635,0.838 0.445,0.838 0.342,1.219 -0.342,1.219 -0.445,0.838 -0.635,0.838 -0.635,-0.838
3D body "SAMTEC_TMS_101-02-G-S.stp": height 5.08, standoff -3.05, extent -0.635,-1.219 0.635,1.219

## SAMTEC_TS-101-T-A [mm] "Single Contact Header -  Top Pin Ø = 0.64mm, Bottom Pin Ø = 0.46mm"
height 8.21
pads (1):
  round 1.4 hole 0.7: 1(0,0)
Top Overlay:
  lines w0.2: -1.27,-0.508 -1.27,0.508 -1.066,1.27 1.066,1.27 1.27,0.508 1.27,-0.508 1.066,-1.27 -1.066,-1.27 -1.27,-0.508
Mechanical 8:
  lines w0.1: -0.5,0 0,0 ; 0,-0.5 0,0 ; 0,0.5 0,0 ; 0.5,0 0,0
Mechanical 14:
  circle w0.1: c0,0 r0.32
  circle w0.1: c0,0 r0.875
  lines w0.1: -1.27,-0.508 -1.27,0.508 -1.066,1.27 1.066,1.27 1.27,0.508 1.27,-0.508 1.066,-1.27 -1.066,-1.27 -1.27,-0.508
3D body "SAMTEC_TS-101-T-A.stp": height 8.2, standoff -3.91, extent -1.27,-1.27 1.27,1.27

## SAMTEC_TS-101-T-A_a [mm] "Single Contact Header -  Top Pin Ø = 0.46mm, Bottom Pin Ø = 0.64mm"
height 7.95
pads (1):
  round 1.9 / inner round 1.6 / far side round 1.6 hole 0.9: 1(0,0)
Top Overlay:
  lines w0.2: -1.27,-0.508 -1.066,-1.27 1.066,-1.27 1.27,-0.508 1.27,0.508 1.066,1.27 -1.066,1.27 -1.27,0.508 -1.27,-0.508
Mechanical 14:
  circle w0.1: c0,0 r0.23
  lines w0.1: -0.875,0 cw(c0,0) -0.619,0.619 ; -0.619,-0.619 ccw(c0,0) 0,-0.875 ; 0,0.875 cw(c0,0) 0.619,0.619 ; 0.619,-0.619 ccw(c0,0) 0.875,0 ; -1.27,-0.508 -1.066,-1.27 1.066,-1.27 1.27,-0.508 1.27,0.508 1.066,1.27 -1.066,1.27 -1.27,0.508 -1.27,-0.508
3D body "SAMTEC_TS-101-T-A_a.stp": height 7.9, standoff -4.22, extent -1.27,-1.27 1.27,1.27

## SAMTEC_TS-101-T-AA [mm] "Single Contact Header -  Top and Bottom Pin Ø = 0.46mm"
height 8.21
pads (1):
  round 1.4 hole 0.7: 1(0,0)
Top Overlay:
  lines w0.2: -1.27,-0.508 -1.066,-1.27 1.066,-1.27 1.27,-0.508 1.27,0.508 1.066,1.27 -1.066,1.27 -1.27,0.508 -1.27,-0.508
Mechanical 8:
  lines w0.1: -0.5,0 0,0 ; 0,-0.5 0,0 ; 0,0.5 0,0 ; 0.5,0 0,0
Mechanical 14:
  circle w0.1: c0,0 r0.875
  circle w0.1: c0,0 r0.23
  lines w0.1: -1.27,-0.508 -1.27,0.508 -1.066,1.27 1.066,1.27 1.27,0.508 1.27,-0.508 1.066,-1.27 -1.066,-1.27 -1.27,-0.508
3D body "SAMTEC_TS-101-T-AA.stp": height 8.15, standoff -3.91, extent -1.27,-1.27 1.27,1.27

## SAMTEC_TS-101-T-AA_a [mm] "Single Contact Header -  Top and Bottom Pin Ø = 0.46mm"
height 7.95
pads (1):
  round 1.9 / inner round 1.4 / far side round 1.4 hole 0.7: 1(0,0)
Top Overlay:
  lines w0.2: -1.27,-0.508 -1.066,-1.27 1.066,-1.27 1.27,-0.508 1.27,0.508 1.066,1.27 -1.066,1.27 -1.27,0.508 -1.27,-0.508
Mechanical 14:
  circle w0.1: c0,0 r0.23
  lines w0.1: -0.875,0 cw(c0,0) -0.619,0.619 ; -0.619,-0.619 ccw(c0,0) 0,-0.875 ; 0,0.875 cw(c0,0) 0.619,0.619 ; 0.619,-0.619 ccw(c0,0) 0.875,0 ; -1.27,-0.508 -1.27,0.508 -1.066,1.27 1.066,1.27 1.27,0.508 1.27,-0.508 1.066,-1.27 -1.066,-1.27 -1.27,-0.508
3D body "SAMTEC_TS-101-T-AA_a.stp": height 7.85, standoff -4.22, extent -1.27,-1.27 1.27,1.27

## SAMTEC_TSS-104-01-G-D [mm] "8 Contacts, Pitch 2.54mm, Dual Row, Through Mount Straight Shrouded Header"
height 9.27
pads (8):
  round 1.9 hole 1.2: 1(-3.81,-1.27) 2(-3.81,1.27) 3(-1.27,-1.27) 4(-1.27,1.27) 5(1.27,-1.27) 6(1.27,1.27) 7(3.81,-1.27) 8(3.81,1.27)
Top Overlay:
  circle w0.3: c-3.775,-5.1 r0.15
  lines w0.2: -4.064,-4.445 -3.81,-3.937 -3.556,-4.445 ; -2.54,-4.445 -2.54,-3.175 ; -2.54,-3.62 -6.16,-3.62 ; 2.54,-4.445 2.54,-3.175 ; 2.54,-3.62 6.16,-3.62 ; -6.16,-3.62 -6.16,3.62 ; -6.16,-3.62 -5.715,-3.175 ; -6.16,3.62 -5.715,3.175 ; -6.16,3.62 6.16,3.62 ; -5.715,-3.175 -5.715,3.175 ; -5.715,-3.175 5.715,-3.175 ; -5.715,3.175 5.715,3.175 ; 5.715,-3.175 5.715,3.175 ; 5.715,-3.175 6.16,-3.62 ; 5.715,3.175 6.16,3.62 ; 6.16,-3.62 6.16,3.62 ; -6.985,-4.445 6.985,-4.445 6.985,4.826 5.715,4.826 5.715,4.445 1.27,4.445 1.27,4.826 -1.27,4.826 -1.27,4.445 -5.715,4.445 -5.715,4.826 -6.985,4.826 -6.985,-4.445
Mechanical 8:
  lines w0.1: -4.31,-1.27 -3.81,-1.27 ; -4.31,1.27 -3.81,1.27 ; -3.81,-1.77 -3.81,-1.27 ; -3.81,-0.77 -3.81,-1.27 ; -3.81,0.77 -3.81,1.27 ; -3.81,1.77 -3.81,1.27 ; -3.31,-1.27 -3.81,-1.27 ; -3.31,1.27 -3.81,1.27 ; -1.77,-1.27 -1.27,-1.27 ; -1.77,1.27 -1.27,1.27 ; -1.27,-1.77 -1.27,-1.27 ; -1.27,-0.77 -1.27,-1.27 ; -1.27,0.77 -1.27,1.27 ; -1.27,1.77 -1.27,1.27 ; -0.77,-1.27 -1.27,-1.27 ; -0.77,1.27 -1.27,1.27 ; -0.5,0 0,0 ; 0,-0.5 0,0 ; 0,0.5 0,0 ; 0.5,0 0,0 ; 0.77,-1.27 1.27,-1.27 ; 0.77,1.27 1.27,1.27 ; 1.27,-1.77 1.27,-1.27 ; 1.27,-0.77 1.27,-1.27 ; 1.27,0.77 1.27,1.27 ; 1.27,1.77 1.27,1.27 ; 1.77,-1.27 1.27,-1.27 ; 1.77,1.27 1.27,1.27 ; 3.31,-1.27 3.81,-1.27 ; 3.31,1.27 3.81,1.27 ; 3.81,-1.77 3.81,-1.27 ; 3.81,-0.77 3.81,-1.27 ; 3.81,0.77 3.81,1.27 ; 3.81,1.77 3.81,1.27 ; 4.31,-1.27 3.81,-1.27 ; 4.31,1.27 3.81,1.27
Mechanical 14:
  circle w0.3: c-3.775,-5.1 r0.15
  lines w0.1: -2.54,-4.445 -2.54,-3.175 ; -2.54,-3.62 -6.16,-3.62 ; 2.54,-4.445 2.54,-3.175 ; 2.54,-3.62 6.16,-3.62 ; -6.16,-3.62 -6.16,3.62 ; -6.16,-3.62 -5.715,-3.175 ; -6.16,3.62 -5.715,3.175 ; -6.16,3.62 6.16,3.62 ; -5.715,-3.175 -5.715,3.175 ; -5.715,-3.175 5.715,-3.175 ; -5.715,3.175 5.715,3.175 ; 5.715,-3.175 5.715,3.175 ; 5.715,-3.175 6.16,-3.62 ; 5.715,3.175 6.16,3.62 ; 6.16,-3.62 6.16,3.62 ; -6.985,-4.445 6.985,-4.445 6.985,4.826 5.715,4.826 5.715,4.445 1.27,4.445 1.27,4.826 -1.27,4.826 -1.27,4.445 -5.715,4.445 -5.715,4.826 -6.985,4.826 -6.985,-4.445 ; -4.127,-1.587 -4.127,-0.953 -3.492,-0.953 -3.492,-1.587 -4.127,-1.587 ; -4.127,0.953 -4.127,1.587 -3.492,1.587 -3.492,0.953 -4.127,0.953 ; -1.587,-1.587 -1.587,-0.953 -0.953,-0.953 -0.953,-1.587 -1.587,-1.587 ; -1.587,0.953 -1.587,1.587 -0.953,1.587 -0.953,0.953 -1.587,0.953 ; 0.953,-1.587 0.953,-0.953 1.587,-0.953 1.587,-1.587 0.953,-1.587 ; 0.953,0.953 0.953,1.587 1.587,1.587 1.587,0.953 0.953,0.953 ; 3.492,-1.587 3.492,-0.953 4.127,-0.953 4.127,-1.587 3.492,-1.587 ; 3.492,0.953 3.492,1.587 4.127,1.587 4.127,0.953 3.492,0.953
3D body "SAMTEC_TSS-104-01-G-D.stp": height 9.27, standoff -2.92, extent -6.985,-4.445 6.985,4.826

## SAMTEC_TSW-101-23-L-D [mm] "2 Contacts - Pitch 2.54mm - Dual Row  Through Mount Straigh Header (Post Lead 5.84mm, Tail Lead 2.92mm, Insulator 2.54mm)"
height 8.38
pads (2):
  round 1.7 hole 1: 1(0,-1.27) 2(0,1.27)
Top Overlay:
  circle w0.3: c0.035,-3.135 r0.15
  lines w0.2: -1.27,-2.54 1.27,-2.54 1.27,2.54 -1.27,2.54 -1.27,-2.54
  text "1" at -2.372,-1.768 h1.2
Mechanical 8:
  lines w0.05: -0.5,-1.27 0,-1.27 ; -0.5,0 0,0 ; -0.5,1.27 0,1.27 ; 0,-1.77 0,-1.27 ; 0,-0.77 0,-1.27 ; 0,-0.5 0,0 ; 0,0.5 0,0 ; 0,0.77 0,1.27 ; 0,1.77 0,1.27 ; 0.5,-1.27 0,-1.27 ; 0.5,0 0,0 ; 0.5,1.27 0,1.27
Mechanical 14:
  lines w0.1: -1.27,-2.54 1.27,-2.54 1.27,2.54 -1.27,2.54 -1.27,-2.54
3D body "SAMTEC_TSW-101-23-L-D.stp": height 8.38, standoff -2.92, extent -1.27,-2.54 1.27,2.54

## SAMTEC_TSW-101-23-L-S [mm] "Single Contact Through Mount Straigh Header (Post Lead 5.84mm, Tail Lead 2.92mm, Insulator 2.54mm)"
height 8.38
pads (1):
  round 1.7 hole 1: 1(0,0)
Top Overlay:
  lines w0.2: -1.27,-1.27 -1.27,1.27 1.007,1.27 1.007,0.762 1.27,0.762 1.27,-0.762 1.007,-0.762 1.007,-1.27 -1.27,-1.27
Mechanical 8:
  lines w0.1: -0.5,0 0,0 ; 0,-0.5 0,0 ; 0,0.5 0,0 ; 0.5,0 0,0
Mechanical 14:
  lines w0.1: 1.007,-0.762 1.27,-0.762 1.27,0.762 1.007,0.762 ; -1.27,-1.27 -1.27,1.27 1.007,1.27 1.007,-1.27 -1.27,-1.27 ; -0.317,-0.318 -0.317,0.317 0.317,0.317 0.318,-0.317 -0.317,-0.318
3D body "SAMTEC_TSW-101-23-L-S.stp": height 8.38, standoff -2.92, extent -1.27,-1.27 1.27,1.27